# Altium schematic symbol library jlcpcb_2025_04_capacitors_extended_0402.schlib: 3594 symbols (part 15 of 20) (continued)
## GRM155R60J106ME11D (continued)

## GRM155R60J106ME15D
designator C?  Capacitance: 10uF  (hidden comment: *)
Capacitor, Ceramic (MLCC), 10uF, ±20%, 6.3V, X5R, ±20%, SMD 0402; Manufacturer: Murata Electronics; Manufacturer Part Number: GRM155R60J106ME15D; Package Size: 0402; JLCPCB Basic Part: No; JLCPCB Part Number: C412251; Supplier 1: LCSC; Category: Capacitors - MLCC; Supplier Part Number 1: C412251; Tolerance: ±20%; Voltage Rating: 6.3V; Temperature Coefficient: X5R; RoHS: Yes; ComponentLink1Description: Datasheet; ComponentLink1URL: https://wmsc.lcsc.com/wmsc/upload/file/pdf/v2/lcsc/2304140030_Murata-Electronics-GRM155R60J106ME15D_C412251.pdf; ComponentLink2Description: JLCPCB Part URL; ComponentLink2URL: https://jlcpcb.com/partdetail/C412251; ComponentLink3Description: LCSC Part URL; ComponentLink3URL: https://lcsc.com/product-detail/Multilayer-Ceramic-Capacitors-MLCC---SMD-SMT_Murata-Electronics-Murata-Electronics-GRM155R60J106ME15D_C412251.html
footprint CAP-0402 (0402 (1005M) Capacitor)
pins: 1, 2

## GRM155R60J106ME44D
designator C?  Capacitance: 10uF  (hidden comment: *)
Capacitor, Ceramic (MLCC), 10uF, ±20%, 6.3V, X5R, ±20%, SMD 0402; Manufacturer: Murata Electronics; Manufacturer Part Number: GRM155R60J106ME44D; Package Size: 0402; JLCPCB Basic Part: No; JLCPCB Part Number: C76991; Supplier 1: LCSC; Category: Capacitors - MLCC; Supplier Part Number 1: C76991; Tolerance: ±20%; Voltage Rating: 6.3V; Temperature Coefficient: X5R; RoHS: Yes; ComponentLink1Description: Datasheet; ComponentLink1URL: https://wmsc.lcsc.com/wmsc/upload/file/pdf/v2/lcsc/2304140030_Murata-Electronics-GRM155R60J106ME44D_C76991.pdf; ComponentLink2Description: JLCPCB Part URL; ComponentLink2URL: https://jlcpcb.com/partdetail/C76991; ComponentLink3Description: LCSC Part URL; ComponentLink3URL: https://lcsc.com/product-detail/Multilayer-Ceramic-Capacitors-MLCC---SMD-SMT_Murata-Electronics-Murata-Electronics-GRM155R60J106ME44D_C76991.html
footprint CAP-0402 (0402 (1005M) Capacitor)
pins: 1, 2

## GRM155R60J106ME47D
designator C?  Capacitance: 10uF  (hidden comment: *)
Capacitor, Ceramic (MLCC), 10uF, ±20%, 6.3V, X5R, ±20%, SMD 0402; Manufacturer: Murata Electronics; Manufacturer Part Number: GRM155R60J106ME47D; Package Size: 0402; JLCPCB Basic Part: No; JLCPCB Part Number: C668351; Supplier 1: LCSC; Category: Capacitors - MLCC; Supplier Part Number 1: C668351; Tolerance: ±20%; Voltage Rating: 6.3V; Temperature Coefficient: X5R; RoHS: Yes; ComponentLink1Description: Datasheet; ComponentLink1URL: https://wmsc.lcsc.com/wmsc/upload/file/pdf/v2/lcsc/2204211715_Murata-Electronics-GRM155R60J106ME47D_C668351.pdf; ComponentLink2Description: JLCPCB Part URL; ComponentLink2URL: https://jlcpcb.com/partdetail/C668351; ComponentLink3Description: LCSC Part URL; ComponentLink3URL: https://lcsc.com/product-detail/Multilayer-Ceramic-Capacitors-MLCC---SMD-SMT_Murata-Electronics-Murata-Electronics-GRM155R60J106ME47D_C668351.html
footprint CAP-0402 (0402 (1005M) Capacitor)
pins: 1, 2

## GRM155R60J156ME05D
designator C?  Capacitance: 15uF  (hidden comment: *)
Capacitor, Ceramic (MLCC), 15uF, ±20%, 6.3V, X5R, ±20%, SMD 0402; Manufacturer: Murata Electronics; Manufacturer Part Number: GRM155R60J156ME05D; Package Size: 0402; JLCPCB Basic Part: No; JLCPCB Part Number: C703069; Supplier 1: LCSC; Category: Capacitors - MLCC; Supplier Part Number 1: C703069; Tolerance: ±20%; Voltage Rating: 6.3V; Temperature Coefficient: X5R; RoHS: Yes; ComponentLink1Description: Datasheet; ComponentLink1URL: https://wmsc.lcsc.com/wmsc/upload/file/pdf/v2/lcsc/2304140030_Murata-Electronics-GRM155R60J156ME05D_C703069.pdf; ComponentLink2Description: JLCPCB Part URL; ComponentLink2URL: https://jlcpcb.com/partdetail/C703069; ComponentLink3Description: LCSC Part URL; ComponentLink3URL: https://lcsc.com/product-detail/Multilayer-Ceramic-Capacitors-MLCC---SMD-SMT_Murata-Electronics-Murata-Electronics-GRM155R60J156ME05D_C703069.html
footprint CAP-0402 (0402 (1005M) Capacitor)
pins: 1, 2

## GRM155R60J225KE01D
designator C?  Capacitance: 2.2uF  (hidden comment: *)
Capacitor, Ceramic (MLCC), 2.2uF, ±10%, 6.3V, X5R, ±10%, SMD 0402; Manufacturer: Murata Electronics; Manufacturer Part Number: GRM155R60J225KE01D; Package Size: 0402; JLCPCB Basic Part: No; JLCPCB Part Number: C319185; Supplier 1: LCSC; Category: Capacitors - MLCC; Supplier Part Number 1: C319185; Tolerance: ±10%; Voltage Rating: 6.3V; Temperature Coefficient: X5R; RoHS: Yes; ComponentLink1Description: Datasheet; ComponentLink1URL: https://wmsc.lcsc.com/wmsc/upload/file/pdf/v2/lcsc/1811081547_Murata-Electronics-GRM155R60J225KE01D_C319185.pdf; ComponentLink2Description: JLCPCB Part URL; ComponentLink2URL: https://jlcpcb.com/partdetail/C319185; ComponentLink3Description: LCSC Part URL; ComponentLink3URL: https://lcsc.com/product-detail/Multilayer-Ceramic-Capacitors-MLCC---SMD-SMT_Murata-Electronics-Murata-Electronics-GRM155R60J225KE01D_C319185.html
footprint CAP-0402 (0402 (1005M) Capacitor)
pins: 1, 2

## GRM155R60J225KE95D
designator C?  Capacitance: 2.2uF  (hidden comment: *)
Capacitor, Ceramic (MLCC), 2.2uF, ±10%, 6.3V, X5R, ±10%, SMD 0402; Manufacturer: Murata Electronics; Manufacturer Part Number: GRM155R60J225KE95D; Package Size: 0402; JLCPCB Basic Part: No; JLCPCB Part Number: C76992; Supplier 1: LCSC; Category: Capacitors - MLCC; Supplier Part Number 1: C76992; Tolerance: ±10%; Voltage Rating: 6.3V; Temperature Coefficient: X5R; RoHS: Yes; ComponentLink1Description: Datasheet; ComponentLink1URL: https://wmsc.lcsc.com/wmsc/upload/file/pdf/v2/lcsc/1811081615_Murata-Electronics-GRM155R60J225KE95D_C76992.pdf; ComponentLink2Description: JLCPCB Part URL; ComponentLink2URL: https://jlcpcb.com/partdetail/C76992; ComponentLink3Description: LCSC Part URL; ComponentLink3URL: https://lcsc.com/product-detail/Multilayer-Ceramic-Capacitors-MLCC---SMD-SMT_Murata-Electronics-Murata-Electronics-GRM155R60J225KE95D_C76992.html
footprint CAP-0402 (0402 (1005M) Capacitor)
pins: 1, 2

## GRM155R60J225ME15D
designator C?  Capacitance: 2.2uF  (hidden comment: *)
Capacitor, Ceramic (MLCC), 2.2uF, ±20%, 6.3V, X5R, ±20%, SMD 0402; Manufacturer: Murata Electronics; Manufacturer Part Number: GRM155R60J225ME15D; Package Size: 0402; JLCPCB Basic Part: No; JLCPCB Part Number: C76993; Supplier 1: LCSC; Category: Capacitors - MLCC; Supplier Part Number 1: C76993; Tolerance: ±20%; Voltage Rating: 6.3V; Temperature Coefficient: X5R; RoHS: Yes; ComponentLink1Description: Datasheet; ComponentLink1URL: https://wmsc.lcsc.com/wmsc/upload/file/pdf/v2/lcsc/1811081611_Murata-Electronics-GRM155R60J225ME15D_C76993.pdf; ComponentLink2Description: JLCPCB Part URL; ComponentLink2URL: https://jlcpcb.com/partdetail/C76993; ComponentLink3Description: LCSC Part URL; ComponentLink3URL: https://lcsc.com/product-detail/Multilayer-Ceramic-Capacitors-MLCC---SMD-SMT_Murata-Electronics-Murata-Electronics-GRM155R60J225ME15D_C76993.html
footprint CAP-0402 (0402 (1005M) Capacitor)
pins: 1, 2

## GRM155R60J225ME95D
designator C?  Capacitance: 2.2uF  (hidden comment: *)
Capacitor, Ceramic (MLCC), 2.2uF, ±20%, 6.3V, X5R, ±20%, SMD 0402; Manufacturer: Murata Electronics; Manufacturer Part Number: GRM155R60J225ME95D; Package Size: 0402; JLCPCB Basic Part: No; JLCPCB Part Number: C162169; Supplier 1: LCSC; Category: Capacitors - MLCC; Supplier Part Number 1: C162169; Tolerance: ±20%; Voltage Rating: 6.3V; Temperature Coefficient: X5R; RoHS: Yes; ComponentLink1Description: Datasheet; ComponentLink1URL: https://wmsc.lcsc.com/wmsc/upload/file/pdf/v2/lcsc/2304140030_Murata-Electronics-GRM155R60J225ME95D_C162169.pdf; ComponentLink2Description: JLCPCB Part URL; ComponentLink2URL: https://jlcpcb.com/partdetail/C162169; ComponentLink3Description: LCSC Part URL; ComponentLink3URL: https://lcsc.com/product-detail/Multilayer-Ceramic-Capacitors-MLCC---SMD-SMT_Murata-Electronics-Murata-Electronics-GRM155R60J225ME95D_C162169.html
footprint CAP-0402 (0402 (1005M) Capacitor)
pins: 1, 2

## GRM155R60J226ME11D
designator C?  Capacitance: 22uF  (hidden comment: *)
Capacitor, Ceramic (MLCC), 22uF, ±20%, 6.3V, X5R, ±20%, SMD 0402; Manufacturer: Murata Electronics; Manufacturer Part Number: GRM155R60J226ME11D; Package Size: 0402; JLCPCB Basic Part: No; JLCPCB Part Number: C415703; Supplier 1: LCSC; Category: Capacitors - MLCC; Supplier Part Number 1: C415703; Tolerance: ±20%; Voltage Rating: 6.3V; Temperature Coefficient: X5R; RoHS: Yes; ComponentLink1Description: Datasheet; ComponentLink1URL: https://wmsc.lcsc.com/wmsc/upload/file/pdf/v2/lcsc/2304140030_Murata-Electronics-GRM155R60J226ME11D_C415703.pdf; ComponentLink2Description: JLCPCB Part URL; ComponentLink2URL: https://jlcpcb.com/partdetail/C415703; ComponentLink3Description: LCSC Part URL; ComponentLink3URL: https://lcsc.com/product-detail/Multilayer-Ceramic-Capacitors-MLCC---SMD-SMT_Murata-Electronics-Murata-Electronics-GRM155R60J226ME11D_C415703.html
footprint CAP-0402 (0402 (1005M) Capacitor)
pins: 1, 2

## GRM155R60J334KE01D
designator C?  Capacitance: 330nF  (hidden comment: *)
Capacitor, Ceramic (MLCC), 330nF, ±10%, 6.3V, X5R, ±10%, SMD 0402; Manufacturer: Murata Electronics; Manufacturer Part Number: GRM155R60J334KE01D; Package Size: 0402; JLCPCB Basic Part: No; JLCPCB Part Number: C113046; Supplier 1: LCSC; Category: Capacitors - MLCC; Supplier Part Number 1: C113046; Tolerance: ±10%; Voltage Rating: 6.3V; Temperature Coefficient: X5R; RoHS: Yes; ComponentLink1Description: Datasheet; ComponentLink1URL: https://wmsc.lcsc.com/wmsc/upload/file/pdf/v2/lcsc/2304140030_Murata-Electronics-GRM155R60J334KE01D_C113046.pdf; ComponentLink2Description: JLCPCB Part URL; ComponentLink2URL: https://jlcpcb.com/partdetail/C113046; ComponentLink3Description: LCSC Part URL; ComponentLink3URL: https://lcsc.com/product-detail/Multilayer-Ceramic-Capacitors-MLCC---SMD-SMT_Murata-Electronics-Murata-Electronics-GRM155R60J334KE01D_C113046.html
footprint CAP-0402 (0402 (1005M) Capacitor)
pins: 1, 2

## GRM155R60J475KE96D
designator C?  Capacitance: 4.7uF  (hidden comment: *)
Capacitor, Ceramic (MLCC), 4.7uF, ±10%, 6.3V, X5R, ±10%, SMD 0402; Manufacturer: Murata Electronics; Manufacturer Part Number: GRM155R60J475KE96D; Package Size: 0402; JLCPCB Basic Part: No; JLCPCB Part Number: C76995; Supplier 1: LCSC; Category: Capacitors - MLCC; Supplier Part Number 1: C76995; Tolerance: ±10%; Voltage Rating: 6.3V; Temperature Coefficient: X5R; RoHS: Yes; ComponentLink1Description: Datasheet; ComponentLink1URL: https://wmsc.lcsc.com/wmsc/upload/file/pdf/v2/lcsc/2304140030_Murata-Electronics-GRM155R60J475KE96D_C76995.pdf; ComponentLink2Description: JLCPCB Part URL; ComponentLink2URL: https://jlcpcb.com/partdetail/C76995; ComponentLink3Description: LCSC Part URL; ComponentLink3URL: https://lcsc.com/product-detail/Multilayer-Ceramic-Capacitors-MLCC---SMD-SMT_Murata-Electronics-Murata-Electronics-GRM155R60J475KE96D_C76995.html
footprint CAP-0402 (0402 (1005M) Capacitor)
pins: 1, 2

## GRM155R60J475ME47D
designator C?  Capacitance: 4.7uF  (hidden comment: *)
Capacitor, Ceramic (MLCC), 4.7uF, ±20%, 6.3V, X5R, ±20%, SMD 0402; Manufacturer: Murata Electronics; Manufacturer Part Number: GRM155R60J475ME47D; Package Size: 0402; JLCPCB Basic Part: No; JLCPCB Part Number: C82453; Supplier 1: LCSC; Category: Capacitors - MLCC; Supplier Part Number 1: C82453; Tolerance: ±20%; Voltage Rating: 6.3V; Temperature Coefficient: X5R; RoHS: Yes; ComponentLink1Description: Datasheet; ComponentLink1URL: https://wmsc.lcsc.com/wmsc/upload/file/pdf/v2/lcsc/1811081616_Murata-Electronics-GRM155R60J475ME47D_C82453.pdf; ComponentLink2Description: JLCPCB Part URL; ComponentLink2URL: https://jlcpcb.com/partdetail/C82453; ComponentLink3Description: LCSC Part URL; ComponentLink3URL: https://lcsc.com/product-detail/Multilayer-Ceramic-Capacitors-MLCC---SMD-SMT_Murata-Electronics-Murata-Electronics-GRM155R60J475ME47D_C82453.html
footprint CAP-0402 (0402 (1005M) Capacitor)
pins: 1, 2

## GRM155R60J475ME87D
designator C?  Capacitance: 4.7uF  (hidden comment: *)
Capacitor, Ceramic (MLCC), 4.7uF, ±20%, 6.3V, X5R, ±20%, SMD 0402; Manufacturer: Murata Electronics; Manufacturer Part Number: GRM155R60J475ME87D; Package Size: 0402; JLCPCB Basic Part: No; JLCPCB Part Number: C76996; Supplier 1: LCSC; Category: Capacitors - MLCC; Supplier Part Number 1: C76996; Tolerance: ±20%; Voltage Rating: 6.3V; Temperature Coefficient: X5R; RoHS: Yes; ComponentLink1Description: Datasheet; ComponentLink1URL: https://wmsc.lcsc.com/wmsc/upload/file/pdf/v2/lcsc/1811081615_Murata-Electronics-GRM155R60J475ME87D_C76996.pdf; ComponentLink2Description: JLCPCB Part URL; ComponentLink2URL: https://jlcpcb.com/partdetail/C76996; ComponentLink3Description: LCSC Part URL; ComponentLink3URL: https://lcsc.com/product-detail/Multilayer-Ceramic-Capacitors-MLCC---SMD-SMT_Murata-Electronics-Murata-Electronics-GRM155R60J475ME87D_C76996.html
footprint CAP-0402 (0402 (1005M) Capacitor)
pins: 1, 2

## GRM155R60J475ME87J
designator C?  Capacitance: 4.7uF  (hidden comment: *)
Capacitor, Ceramic (MLCC), 4.7uF, ±20%, 6.3V, X5R, ±20%, SMD 0402; Manufacturer: Murata Electronics; Manufacturer Part Number: GRM155R60J475ME87J; Package Size: 0402; JLCPCB Basic Part: No; JLCPCB Part Number: C2176953; Supplier 1: LCSC; Category: Capacitors - MLCC; Supplier Part Number 1: C2176953; Tolerance: ±20%; Voltage Rating: 6.3V; Temperature Coefficient: X5R; RoHS: Yes; ComponentLink1Description: Datasheet; ComponentLink1URL: https://wmsc.lcsc.com/wmsc/upload/file/pdf/v2/lcsc/2202040900_Murata-Electronics-GRM155R60J475ME87J_C2176953.pdf; ComponentLink2Description: JLCPCB Part URL; ComponentLink2URL: https://jlcpcb.com/partdetail/C2176953; ComponentLink3Description: LCSC Part URL; ComponentLink3URL: https://lcsc.com/product-detail/Multilayer-Ceramic-Capacitors-MLCC---SMD-SMT_Murata-Electronics-Murata-Electronics-GRM155R60J475ME87J_C2176953.html
footprint CAP-0402 (0402 (1005M) Capacitor)
pins: 1, 2

## GRM155R61A105KE01D
designator C?  Capacitance: 1uF  (hidden comment: *)
Capacitor, Ceramic (MLCC), 1uF, ±10%, 10V, X5R, ±10%, SMD 0402; Manufacturer: Murata Electronics; Manufacturer Part Number: GRM155R61A105KE01D; Package Size: 0402; JLCPCB Basic Part: No; JLCPCB Part Number: C389008; Supplier 1: LCSC; Category: Capacitors - MLCC; Supplier Part Number 1: C389008; Tolerance: ±10%; Voltage Rating: 10V; Temperature Coefficient: X5R; RoHS: Yes; ComponentLink1Description: Datasheet; ComponentLink1URL: https://wmsc.lcsc.com/wmsc/upload/file/pdf/v2/lcsc/1912111437_Murata-Electronics-GRM155R61A105KE01D_C389008.pdf; ComponentLink2Description: JLCPCB Part URL; ComponentLink2URL: https://jlcpcb.com/partdetail/C389008; ComponentLink3Description: LCSC Part URL; ComponentLink3URL: https://lcsc.com/product-detail/Multilayer-Ceramic-Capacitors-MLCC---SMD-SMT_Murata-Electronics-Murata-Electronics-GRM155R61A105KE01D_C389008.html
footprint CAP-0402 (0402 (1005M) Capacitor)
pins: 1, 2

## GRM155R61A105KE15D
designator C?  Capacitance: 1uF  (hidden comment: *)
Capacitor, Ceramic (MLCC), 1uF, ±10%, 10V, X5R, ±10%, SMD 0402; Manufacturer: Murata Electronics; Manufacturer Part Number: GRM155R61A105KE15D; Package Size: 0402; JLCPCB Basic Part: No; JLCPCB Part Number: C76999; Supplier 1: LCSC; Category: Capacitors - MLCC; Supplier Part Number 1: C76999; Tolerance: ±10%; Voltage Rating: 10V; Temperature Coefficient: X5R; RoHS: Yes; ComponentLink1Description: Datasheet; ComponentLink1URL: https://wmsc.lcsc.com/wmsc/upload/file/pdf/v2/lcsc/1810201320_Murata-Electronics-GRM155R61A105KE15D_C76999.pdf; ComponentLink2Description: JLCPCB Part URL; ComponentLink2URL: https://jlcpcb.com/partdetail/C76999; ComponentLink3Description: LCSC Part URL; ComponentLink3URL: https://lcsc.com/product-detail/Multilayer-Ceramic-Capacitors-MLCC---SMD-SMT_Murata-Electronics-Murata-Electronics-GRM155R61A105KE15D_C76999.html
footprint CAP-0402 (0402 (1005M) Capacitor)
pins: 1, 2

## GRM155R61A106ME11D
designator C?  Capacitance: 10uF  (hidden comment: *)
Capacitor, Ceramic (MLCC), 10uF, ±20%, 10V, X5R, ±20%, SMD 0402; Manufacturer: Murata Electronics; Manufacturer Part Number: GRM155R61A106ME11D; Package Size: 0402; JLCPCB Basic Part: No; JLCPCB Part Number: C408132; Supplier 1: LCSC; Category: Capacitors - MLCC; Supplier Part Number 1: C408132; Tolerance: ±20%; Voltage Rating: 10V; Temperature Coefficient: X5R; RoHS: Yes; ComponentLink1Description: Datasheet; ComponentLink1URL: https://wmsc.lcsc.com/wmsc/upload/file/pdf/v2/lcsc/2304140030_Murata-Electronics-GRM155R61A106ME11D_C408132.pdf; ComponentLink2Description: JLCPCB Part URL; ComponentLink2URL: https://jlcpcb.com/partdetail/C408132; ComponentLink3Description: LCSC Part URL; ComponentLink3URL: https://lcsc.com/product-detail/Multilayer-Ceramic-Capacitors-MLCC---SMD-SMT_Murata-Electronics-Murata-Electronics-GRM155R61A106ME11D_C408132.html
footprint CAP-0402 (0402 (1005M) Capacitor)
pins: 1, 2

## GRM155R61A106ME21D
designator C?  Capacitance: 10uF  (hidden comment: *)
Capacitor, Ceramic (MLCC), 10uF, ±20%, 10V, X5R, ±20%, SMD 0402; Manufacturer: Murata Electronics; Manufacturer Part Number: GRM155R61A106ME21D; Package Size: 0402; JLCPCB Basic Part: No; JLCPCB Part Number: C324476; Supplier 1: LCSC; Category: Capacitors - MLCC; Supplier Part Number 1: C324476; Tolerance: ±20%; Voltage Rating: 10V; Temperature Coefficient: X5R; RoHS: Yes; ComponentLink1Description: Datasheet; ComponentLink1URL: https://wmsc.lcsc.com/wmsc/upload/file/pdf/v2/lcsc/1811071230_Murata-Electronics-GRM155R61A106ME21D_C324476.pdf; ComponentLink2Description: JLCPCB Part URL; ComponentLink2URL: https://jlcpcb.com/partdetail/C324476; ComponentLink3Description: LCSC Part URL; ComponentLink3URL: https://lcsc.com/product-detail/Multilayer-Ceramic-Capacitors-MLCC---SMD-SMT_Murata-Electronics-Murata-Electronics-GRM155R61A106ME21D_C324476.html
footprint CAP-0402 (0402 (1005M) Capacitor)
pins: 1, 2

## GRM155R61A106ME44D
designator C?  Capacitance: 10uF  (hidden comment: *)
Capacitor, Ceramic (MLCC), 10uF, ±20%, 10V, X5R, ±20%, SMD 0402; Manufacturer: Murata Electronics; Manufacturer Part Number: GRM155R61A106ME44D; Package Size: 0402; JLCPCB Basic Part: No; JLCPCB Part Number: C77000; Supplier 1: LCSC; Category: Capacitors - MLCC; Supplier Part Number 1: C77000; Tolerance: ±20%; Voltage Rating: 10V; Temperature Coefficient: X5R; RoHS: Yes; ComponentLink1Description: Datasheet; ComponentLink1URL: https://wmsc.lcsc.com/wmsc/upload/file/pdf/v2/lcsc/1811141510_Murata-Electronics-GRM155R61A106ME44D_C77000.pdf; ComponentLink2Description: JLCPCB Part URL; ComponentLink2URL: https://jlcpcb.com/partdetail/C77000; ComponentLink3Description: LCSC Part URL; ComponentLink3URL: https://lcsc.com/product-detail/Multilayer-Ceramic-Capacitors-MLCC---SMD-SMT_Murata-Electronics-Murata-Electronics-GRM155R61A106ME44D_C77000.html
footprint CAP-0402 (0402 (1005M) Capacitor)
pins: 1, 2

## GRM155R61A124KE19D
designator C?  Capacitance: 120nF  (hidden comment: *)
Capacitor, Ceramic (MLCC), 120nF, ±10%, 10V, X5R, ±10%, SMD 0402; Manufacturer: Murata Electronics; Manufacturer Part Number: GRM155R61A124KE19D; Package Size: 0402; JLCPCB Basic Part: No; JLCPCB Part Number: C426033; Supplier 1: LCSC; Category: Capacitors - MLCC; Supplier Part Number 1: C426033; Tolerance: ±10%; Voltage Rating: 10V; Temperature Coefficient: X5R; RoHS: Yes; ComponentLink1Description: Datasheet; ComponentLink1URL: https://wmsc.lcsc.com/wmsc/upload/file/pdf/v2/lcsc/2304140030_Murata-Electronics-GRM155R61A124KE19D_C426033.pdf; ComponentLink2Description: JLCPCB Part URL; ComponentLink2URL: https://jlcpcb.com/partdetail/C426033; ComponentLink3Description: LCSC Part URL; ComponentLink3URL: https://lcsc.com/product-detail/Multilayer-Ceramic-Capacitors-MLCC---SMD-SMT_Murata-Electronics-Murata-Electronics-GRM155R61A124KE19D_C426033.html
footprint CAP-0402 (0402 (1005M) Capacitor)
pins: 1, 2

## GRM155R61A224JE19D
designator C?  Capacitance: 220nF  (hidden comment: *)
Capacitor, Ceramic (MLCC), 220nF, ±5%, 10V, X5R, ±5%, SMD 0402; Manufacturer: Murata Electronics; Manufacturer Part Number: GRM155R61A224JE19D; Package Size: 0402; JLCPCB Basic Part: No; JLCPCB Part Number: C882536; Supplier 1: LCSC; Category: Capacitors - MLCC; Supplier Part Number 1: C882536; Tolerance: ±5%; Voltage Rating: 10V; Temperature Coefficient: X5R; RoHS: Yes; ComponentLink1Description: Datasheet; ComponentLink1URL: https://wmsc.lcsc.com/wmsc/upload/file/pdf/v2/lcsc/2201242130_Murata-Electronics-GRM155R61A224JE19D_C882536.pdf; ComponentLink2Description: JLCPCB Part URL; ComponentLink2URL: https://jlcpcb.com/partdetail/C882536; ComponentLink3Description: LCSC Part URL; ComponentLink3URL: https://lcsc.com/product-detail/Multilayer-Ceramic-Capacitors-MLCC---SMD-SMT_Murata-Electronics-Murata-Electronics-GRM155R61A224JE19D_C882536.html
footprint CAP-0402 (0402 (1005M) Capacitor)
pins: 1, 2

## GRM155R61A224KE19D
designator C?  Capacitance: 220nF  (hidden comment: *)
Capacitor, Ceramic (MLCC), 220nF, ±10%, 10V, X5R, ±10%, SMD 0402; Manufacturer: Murata Electronics; Manufacturer Part Number: GRM155R61A224KE19D; Package Size: 0402; JLCPCB Basic Part: No; JLCPCB Part Number: C77001; Supplier 1: LCSC; Category: Capacitors - MLCC; Supplier Part Number 1: C77001; Tolerance: ±10%; Voltage Rating: 10V; Temperature Coefficient: X5R; RoHS: Yes; ComponentLink1Description: Datasheet; ComponentLink1URL: https://wmsc.lcsc.com/wmsc/upload/file/pdf/v2/lcsc/1810201311_Murata-Electronics-GRM155R61A224KE19D_C77001.pdf; ComponentLink2Description: JLCPCB Part URL; ComponentLink2URL: https://jlcpcb.com/partdetail/C77001; ComponentLink3Description: LCSC Part URL; ComponentLink3URL: https://lcsc.com/product-detail/Multilayer-Ceramic-Capacitors-MLCC---SMD-SMT_Murata-Electronics-Murata-Electronics-GRM155R61A224KE19D_C77001.html
footprint CAP-0402 (0402 (1005M) Capacitor)
pins: 1, 2

## GRM155R61A225KE01D
designator C?  Capacitance: 2.2uF  (hidden comment: *)
Capacitor, Ceramic (MLCC), 2.2uF, ±10%, 10V, X5R, ±10%, SMD 0402; Manufacturer: Murata Electronics; Manufacturer Part Number: GRM155R61A225KE01D; Package Size: 0402; JLCPCB Basic Part: No; JLCPCB Part Number: C907966; Supplier 1: LCSC; Category: Capacitors - MLCC; Supplier Part Number 1: C907966; Tolerance: ±10%; Voltage Rating: 10V; Temperature Coefficient: X5R; RoHS: Yes; ComponentLink1Description: Datasheet; ComponentLink1URL: https://wmsc.lcsc.com/wmsc/upload/file/pdf/v2/lcsc/2201242100_Murata-Electronics-GRM155R61A225KE01D_C907966.pdf; ComponentLink2Description: JLCPCB Part URL; ComponentLink2URL: https://jlcpcb.com/partdetail/C907966; ComponentLink3Description: LCSC Part URL; ComponentLink3URL: https://lcsc.com/product-detail/Multilayer-Ceramic-Capacitors-MLCC---SMD-SMT_Murata-Electronics-Murata-Electronics-GRM155R61A225KE01D_C907966.html
footprint CAP-0402 (0402 (1005M) Capacitor)
pins: 1, 2

## GRM155R61A225KE95D
designator C?  Capacitance: 2.2uF  (hidden comment: *)
Capacitor, Ceramic (MLCC), 2.2uF, ±10%, 10V, X5R, ±10%, SMD 0402; Manufacturer: Murata Electronics; Manufacturer Part Number: GRM155R61A225KE95D; Package Size: 0402; JLCPCB Basic Part: No; JLCPCB Part Number: C77002; Supplier 1: LCSC; Category: Capacitors - MLCC; Supplier Part Number 1: C77002; Tolerance: ±10%; Voltage Rating: 10V; Temperature Coefficient: X5R; RoHS: Yes; ComponentLink1Description: Datasheet; ComponentLink1URL: https://wmsc.lcsc.com/wmsc/upload/file/pdf/v2/lcsc/1811081616_Murata-Electronics-GRM155R61A225KE95D_C77002.pdf; ComponentLink2Description: JLCPCB Part URL; ComponentLink2URL: https://jlcpcb.com/partdetail/C77002; ComponentLink3Description: LCSC Part URL; ComponentLink3URL: https://lcsc.com/product-detail/Multilayer-Ceramic-Capacitors-MLCC---SMD-SMT_Murata-Electronics-Murata-Electronics-GRM155R61A225KE95D_C77002.html
footprint CAP-0402 (0402 (1005M) Capacitor)
pins: 1, 2

## GRM155R61A225ME01D
designator C?  Capacitance: 2.2uF  (hidden comment: *)
Capacitor, Ceramic (MLCC), 2.2uF, ±20%, 10V, X5R, ±20%, SMD 0402; Manufacturer: Murata Electronics; Manufacturer Part Number: GRM155R61A225ME01D; Package Size: 0402; JLCPCB Basic Part: No; JLCPCB Part Number: C385031; Supplier 1: LCSC; Category: Capacitors - MLCC; Supplier Part Number 1: C385031; Tolerance: ±20%; Voltage Rating: 10V; Temperature Coefficient: X5R; RoHS: Yes; ComponentLink1Description: Datasheet; ComponentLink1URL: https://wmsc.lcsc.com/wmsc/upload/file/pdf/v2/lcsc/1912111437_Murata-Electronics-GRM155R61A225ME01D_C385031.pdf; ComponentLink2Description: JLCPCB Part URL; ComponentLink2URL: https://jlcpcb.com/partdetail/C385031; ComponentLink3Description: LCSC Part URL; ComponentLink3URL: https://lcsc.com/product-detail/Multilayer-Ceramic-Capacitors-MLCC---SMD-SMT_Murata-Electronics-Murata-Electronics-GRM155R61A225ME01D_C385031.html
footprint CAP-0402 (0402 (1005M) Capacitor)
pins: 1, 2

## GRM155R61A274KE15D
designator C?  Capacitance: 270nF  (hidden comment: *)
Capacitor, Ceramic (MLCC), 270nF, ±10%, 10V, X5R, ±10%, SMD 0402; Manufacturer: Murata Electronics; Manufacturer Part Number: GRM155R61A274KE15D; Package Size: 0402; JLCPCB Basic Part: No; JLCPCB Part Number: C701264; Supplier 1: LCSC; Category: Capacitors - MLCC; Supplier Part Number 1: C701264; Tolerance: ±10%; Voltage Rating: 10V; Temperature Coefficient: X5R; RoHS: Yes; ComponentLink1Description: Datasheet; ComponentLink1URL: https://wmsc.lcsc.com/wmsc/upload/file/pdf/v2/lcsc/2304140030_Murata-Electronics-GRM155R61A274KE15D_C701264.pdf; ComponentLink2Description: JLCPCB Part URL; ComponentLink2URL: https://jlcpcb.com/partdetail/C701264; ComponentLink3Description: LCSC Part URL; ComponentLink3URL: https://lcsc.com/product-detail/Multilayer-Ceramic-Capacitors-MLCC---SMD-SMT_Murata-Electronics-Murata-Electronics-GRM155R61A274KE15D_C701264.html
footprint CAP-0402 (0402 (1005M) Capacitor)
pins: 1, 2

## GRM155R61A333KA01D
designator C?  Capacitance: 33nF  (hidden comment: *)
Capacitor, Ceramic (MLCC), 33nF, ±10%, 10V, X5R, ±10%, SMD 0402; Manufacturer: Murata Electronics; Manufacturer Part Number: GRM155R61A333KA01D; Package Size: 0402; JLCPCB Basic Part: No; JLCPCB Part Number: C162172; Supplier 1: LCSC; Category: Capacitors - MLCC; Supplier Part Number 1: C162172; Tolerance: ±10%; Voltage Rating: 10V; Temperature Coefficient: X5R; RoHS: Yes; ComponentLink1Description: Datasheet; ComponentLink1URL: https://wmsc.lcsc.com/wmsc/upload/file/pdf/v2/lcsc/2304140030_Murata-Electronics-GRM155R61A333KA01D_C162172.pdf; ComponentLink2Description: JLCPCB Part URL; ComponentLink2URL: https://jlcpcb.com/partdetail/C162172; ComponentLink3Description: LCSC Part URL; ComponentLink3URL: https://lcsc.com/product-detail/Multilayer-Ceramic-Capacitors-MLCC---SMD-SMT_Murata-Electronics-Murata-Electronics-GRM155R61A333KA01D_C162172.html
footprint CAP-0402 (0402 (1005M) Capacitor)
pins: 1, 2

## GRM155R61A393KA01D
designator C?  Capacitance: 39nF  (hidden comment: *)
Capacitor, Ceramic (MLCC), 39nF, ±10%, 10V, X5R, ±10%, SMD 0402; Manufacturer: Murata Electronics; Manufacturer Part Number: GRM155R61A393KA01D; Package Size: 0402; JLCPCB Basic Part: No; JLCPCB Part Number: C470849; Supplier 1: LCSC; Category: Capacitors - MLCC; Supplier Part Number 1: C470849; Tolerance: ±10%; Voltage Rating: 10V; Temperature Coefficient: X5R; RoHS: Yes; ComponentLink1Description: Datasheet; ComponentLink1URL: https://wmsc.lcsc.com/wmsc/upload/file/pdf/v2/lcsc/1912181209_Murata-Electronics-GRM155R61A393KA01D_C470849.pdf; ComponentLink2Description: JLCPCB Part URL; ComponentLink2URL: https://jlcpcb.com/partdetail/C470849; ComponentLink3Description: LCSC Part URL; ComponentLink3URL: https://lcsc.com/product-detail/Multilayer-Ceramic-Capacitors-MLCC---SMD-SMT_Murata-Electronics-Murata-Electronics-GRM155R61A393KA01D_C470849.html
footprint CAP-0402 (0402 (1005M) Capacitor)
pins: 1, 2

## GRM155R61A394KE15D
designator C?  Capacitance: 390nF  (hidden comment: *)
Capacitor, Ceramic (MLCC), 390nF, ±10%, 10V, X5R, ±10%, SMD 0402; Manufacturer: Murata Electronics; Manufacturer Part Number: GRM155R61A394KE15D; Package Size: 0402; JLCPCB Basic Part: No; JLCPCB Part Number: C350937; Supplier 1: LCSC; Category: Capacitors - MLCC; Supplier Part Number 1: C350937; Tolerance: ±10%; Voltage Rating: 10V; Temperature Coefficient: X5R; RoHS: Yes; ComponentLink1Description: Datasheet; ComponentLink1URL: https://wmsc.lcsc.com/wmsc/upload/file/pdf/v2/lcsc/1912111437_Murata-Electronics-GRM155R61A394KE15D_C350937.pdf; ComponentLink2Description: JLCPCB Part URL; ComponentLink2URL: https://jlcpcb.com/partdetail/C350937; ComponentLink3Description: LCSC Part URL; ComponentLink3URL: https://lcsc.com/product-detail/Multilayer-Ceramic-Capacitors-MLCC---SMD-SMT_Murata-Electronics-Murata-Electronics-GRM155R61A394KE15D_C350937.html
footprint CAP-0402 (0402 (1005M) Capacitor)
pins: 1, 2

## GRM155R61A474KE15D
designator C?  Capacitance: 470nF  (hidden comment: *)
Capacitor, Ceramic (MLCC), 470nF, ±10%, 10V, X5R, ±10%, SMD 0402; Manufacturer: Murata Electronics; Manufacturer Part Number: GRM155R61A474KE15D; Package Size: 0402; JLCPCB Basic Part: No; JLCPCB Part Number: C77003; Supplier 1: LCSC; Category: Capacitors - MLCC; Supplier Part Number 1: C77003; Tolerance: ±10%; Voltage Rating: 10V; Temperature Coefficient: X5R; RoHS: Yes; ComponentLink1Description: Datasheet; ComponentLink1URL: https://wmsc.lcsc.com/wmsc/upload/file/pdf/v2/lcsc/1811081612_Murata-Electronics-GRM155R61A474KE15D_C77003.pdf; ComponentLink2Description: JLCPCB Part URL; ComponentLink2URL: https://jlcpcb.com/partdetail/C77003; ComponentLink3Description: LCSC Part URL; ComponentLink3URL: https://lcsc.com/product-detail/Multilayer-Ceramic-Capacitors-MLCC---SMD-SMT_Murata-Electronics-Murata-Electronics-GRM155R61A474KE15D_C77003.html
footprint CAP-0402 (0402 (1005M) Capacitor)
pins: 1, 2

## GRM155R61A474ME15D
designator C?  Capacitance: 470nF  (hidden comment: *)
Capacitor, Ceramic (MLCC), 470nF, ±20%, 10V, X5R, ±20%, SMD 0402; Manufacturer: Murata Electronics; Manufacturer Part Number: GRM155R61A474ME15D; Package Size: 0402; JLCPCB Basic Part: No; JLCPCB Part Number: C692638; Supplier 1: LCSC; Category: Capacitors - MLCC; Supplier Part Number 1: C692638; Tolerance: ±20%; Voltage Rating: 10V; Temperature Coefficient: X5R; RoHS: Yes; ComponentLink1Description: Datasheet; ComponentLink1URL: https://wmsc.lcsc.com/wmsc/upload/file/pdf/v2/lcsc/2401241420_Murata-Electronics-GRM155R61A474ME15D_C692638.pdf; ComponentLink2Description: JLCPCB Part URL; ComponentLink2URL: https://jlcpcb.com/partdetail/C692638; ComponentLink3Description: LCSC Part URL; ComponentLink3URL: https://lcsc.com/product-detail/Multilayer-Ceramic-Capacitors-MLCC---SMD-SMT_Murata-Electronics-Murata-Electronics-GRM155R61A474ME15D_C692638.html
footprint CAP-0402 (0402 (1005M) Capacitor)
pins: 1, 2

## GRM155R61A475KEAAD
designator C?  Capacitance: 4.7uF  (hidden comment: *)
Capacitor, Ceramic (MLCC), 4.7uF, ±10%, 10V, X5R, ±10%, SMD 0402; Manufacturer: Murata Electronics; Manufacturer Part Number: GRM155R61A475KEAAD; Package Size: 0402; JLCPCB Basic Part: No; JLCPCB Part Number: C77004; Supplier 1: LCSC; Category: Capacitors - MLCC; Supplier Part Number 1: C77004; Tolerance: ±10%; Voltage Rating: 10V; Temperature Coefficient: X5R; RoHS: Yes; ComponentLink1Description: Datasheet; ComponentLink1URL: https://wmsc.lcsc.com/wmsc/upload/file/pdf/v2/lcsc/1811081617_Murata-Electronics-GRM155R61A475KEAAD_C77004.pdf; ComponentLink2Description: JLCPCB Part URL; ComponentLink2URL: https://jlcpcb.com/partdetail/C77004; ComponentLink3Description: LCSC Part URL; ComponentLink3URL: https://lcsc.com/product-detail/Multilayer-Ceramic-Capacitors-MLCC---SMD-SMT_Murata-Electronics-Murata-Electronics-GRM155R61A475KEAAD_C77004.html
footprint CAP-0402 (0402 (1005M) Capacitor)
pins: 1, 2

## GRM155R61A475ME02D
designator C?  Capacitance: 4.7uF  (hidden comment: *)
Capacitor, Ceramic (MLCC), 4.7uF, ±20%, 10V, X5R, ±20%, SMD 0402; Manufacturer: Murata Electronics; Manufacturer Part Number: GRM155R61A475ME02D; Package Size: 0402; JLCPCB Basic Part: No; JLCPCB Part Number: C669501; Supplier 1: LCSC; Category: Capacitors - MLCC; Supplier Part Number 1: C669501; Tolerance: ±20%; Voltage Rating: 10V; Temperature Coefficient: X5R; RoHS: Yes; ComponentLink1Description: Datasheet; ComponentLink1URL: https://wmsc.lcsc.com/wmsc/upload/file/pdf/v2/lcsc/2007221808_Murata-Electronics-GRM155R61A475ME02D_C669501.pdf; ComponentLink2Description: JLCPCB Part URL; ComponentLink2URL: https://jlcpcb.com/partdetail/C669501; ComponentLink3Description: LCSC Part URL; ComponentLink3URL: https://lcsc.com/product-detail/Multilayer-Ceramic-Capacitors-MLCC---SMD-SMT_Murata-Electronics-Murata-Electronics-GRM155R61A475ME02D_C669501.html
footprint CAP-0402 (0402 (1005M) Capacitor)
pins: 1, 2

## GRM155R61A475MEAAD
designator C?  Capacitance: 4.7uF  (hidden comment: *)
Capacitor, Ceramic (MLCC), 4.7uF, ±20%, 10V, X5R, ±20%, SMD 0402; Manufacturer: Murata Electronics; Manufacturer Part Number: GRM155R61A475MEAAD; Package Size: 0402; JLCPCB Basic Part: No; JLCPCB Part Number: C335105; Supplier 1: LCSC; Category: Capacitors - MLCC; Supplier Part Number 1: C335105; Tolerance: ±20%; Voltage Rating: 10V; Temperature Coefficient: X5R; RoHS: Yes; ComponentLink1Description: Datasheet; ComponentLink1URL: https://wmsc.lcsc.com/wmsc/upload/file/pdf/v2/lcsc/2304140030_Murata-Electronics-GRM155R61A475MEAAD_C335105.pdf; ComponentLink2Description: JLCPCB Part URL; ComponentLink2URL: https://jlcpcb.com/partdetail/C335105; ComponentLink3Description: LCSC Part URL; ComponentLink3URL: https://lcsc.com/product-detail/Multilayer-Ceramic-Capacitors-MLCC---SMD-SMT_Murata-Electronics-Murata-Electronics-GRM155R61A475MEAAD_C335105.html
footprint CAP-0402 (0402 (1005M) Capacitor)
pins: 1, 2

## GRM155R61A564KE15D
designator C?  Capacitance: 560nF  (hidden comment: *)
Capacitor, Ceramic (MLCC), 560nF, ±10%, 10V, X5R, ±10%, SMD 0402; Manufacturer: Murata Electronics; Manufacturer Part Number: GRM155R61A564KE15D; Package Size: 0402; JLCPCB Basic Part: No; JLCPCB Part Number: C162174; Supplier 1: LCSC; Category: Capacitors - MLCC; Supplier Part Number 1: C162174; Tolerance: ±10%; Voltage Rating: 10V; Temperature Coefficient: X5R; RoHS: Yes; ComponentLink1Description: Datasheet; ComponentLink1URL: https://wmsc.lcsc.com/wmsc/upload/file/pdf/v2/lcsc/2304140030_Murata-Electronics-GRM155R61A564KE15D_C162174.pdf; ComponentLink2Description: JLCPCB Part URL; ComponentLink2URL: https://jlcpcb.com/partdetail/C162174; ComponentLink3Description: LCSC Part URL; ComponentLink3URL: https://lcsc.com/product-detail/Multilayer-Ceramic-Capacitors-MLCC---SMD-SMT_Murata-Electronics-Murata-Electronics-GRM155R61A564KE15D_C162174.html
footprint CAP-0402 (0402 (1005M) Capacitor)
pins: 1, 2

## GRM155R61A684KE15D
designator C?  Capacitance: 680nF  (hidden comment: *)
Capacitor, Ceramic (MLCC), 680nF, ±10%, 10V, X5R, ±10%, SMD 0402; Manufacturer: Murata Electronics; Manufacturer Part Number: GRM155R61A684KE15D; Package Size: 0402; JLCPCB Basic Part: No; JLCPCB Part Number: C97866; Supplier 1: LCSC; Category: Capacitors - MLCC; Supplier Part Number 1: C97866; Tolerance: ±10%; Voltage Rating: 10V; Temperature Coefficient: X5R; RoHS: Yes; ComponentLink1Description: Datasheet; ComponentLink1URL: https://wmsc.lcsc.com/wmsc/upload/file/pdf/v2/lcsc/1811081531_Murata-Electronics-GRM155R61A684KE15D_C97866.pdf; ComponentLink2Description: JLCPCB Part URL; ComponentLink2URL: https://jlcpcb.com/partdetail/C97866; ComponentLink3Description: LCSC Part URL; ComponentLink3URL: https://lcsc.com/product-detail/Multilayer-Ceramic-Capacitors-MLCC---SMD-SMT_Murata-Electronics-Murata-Electronics-GRM155R61A684KE15D_C97866.html
footprint CAP-0402 (0402 (1005M) Capacitor)
pins: 1, 2

## GRM155R61C102KA01D
designator C?  Capacitance: 1nF  (hidden comment: *)
Capacitor, Ceramic (MLCC), 1nF, ±10%, 16V, X5R, ±10%, SMD 0402; Manufacturer: Murata Electronics; Manufacturer Part Number: GRM155R61C102KA01D; Package Size: 0402; JLCPCB Basic Part: No; JLCPCB Part Number: C437524; Supplier 1: LCSC; Category: Capacitors - MLCC; Supplier Part Number 1: C437524; Tolerance: ±10%; Voltage Rating: 16V; Temperature Coefficient: X5R; RoHS: Yes; ComponentLink1Description: Datasheet; ComponentLink1URL: https://wmsc.lcsc.com/wmsc/upload/file/pdf/v2/lcsc/2304140030_Murata-Electronics-GRM155R61C102KA01D_C437524.pdf; ComponentLink2Description: JLCPCB Part URL; ComponentLink2URL: https://jlcpcb.com/partdetail/C437524; ComponentLink3Description: LCSC Part URL; ComponentLink3URL: https://lcsc.com/product-detail/Multilayer-Ceramic-Capacitors-MLCC---SMD-SMT_Murata-Electronics-Murata-Electronics-GRM155R61C102KA01D_C437524.html
footprint CAP-0402 (0402 (1005M) Capacitor)
pins: 1, 2

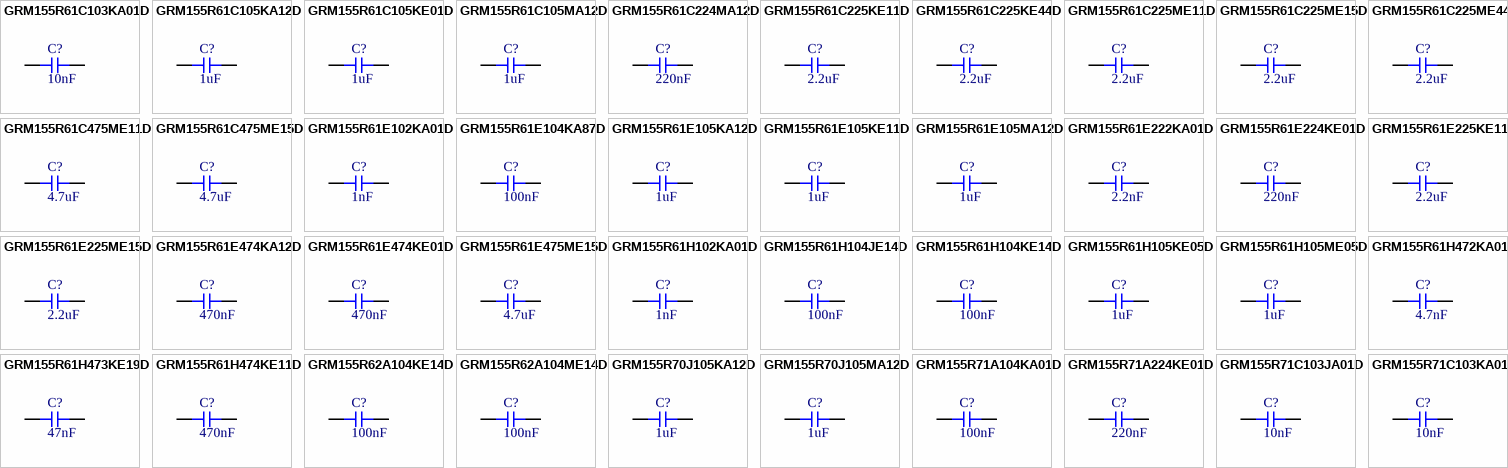
[diagram p68: symbols GRM155R61C103KA01D to GRM155R71C103KA01D]

## GRM155R61C103KA01D
designator C?  Capacitance: 10nF  (hidden comment: *)
Capacitor, Ceramic (MLCC), 10nF, ±10%, 16V, X5R, ±10%, SMD 0402; Manufacturer: Murata Electronics; Manufacturer Part Number: GRM155R61C103KA01D; Package Size: 0402; JLCPCB Basic Part: No; JLCPCB Part Number: C437525; Supplier 1: LCSC; Category: Capacitors - MLCC; Supplier Part Number 1: C437525; Tolerance: ±10%; Voltage Rating: 16V; Temperature Coefficient: X5R; RoHS: Yes; ComponentLink1Description: Datasheet; ComponentLink1URL: https://wmsc.lcsc.com/wmsc/upload/file/pdf/v2/lcsc/2304140030_Murata-Electronics-GRM155R61C103KA01D_C437525.pdf; ComponentLink2Description: JLCPCB Part URL; ComponentLink2URL: https://jlcpcb.com/partdetail/C437525; ComponentLink3Description: LCSC Part URL; ComponentLink3URL: https://lcsc.com/product-detail/Multilayer-Ceramic-Capacitors-MLCC---SMD-SMT_Murata-Electronics-Murata-Electronics-GRM155R61C103KA01D_C437525.html
footprint CAP-0402 (0402 (1005M) Capacitor)
pins: 1, 2

## GRM155R61C105KA12D
designator C?  Capacitance: 1uF  (hidden comment: *)
Capacitor, Ceramic (MLCC), 1uF, ±10%, 16V, X5R, ±10%, SMD 0402; Manufacturer: Murata Electronics; Manufacturer Part Number: GRM155R61C105KA12D; Package Size: 0402; JLCPCB Basic Part: No; JLCPCB Part Number: C77006; Supplier 1: LCSC; Category: Capacitors - MLCC; Supplier Part Number 1: C77006; Tolerance: ±10%; Voltage Rating: 16V; Temperature Coefficient: X5R; RoHS: Yes; ComponentLink1Description: Datasheet; ComponentLink1URL: https://wmsc.lcsc.com/wmsc/upload/file/pdf/v2/lcsc/1811151411_Murata-Electronics-GRM155R61C105KA12D_C77006.pdf; ComponentLink2Description: JLCPCB Part URL; ComponentLink2URL: https://jlcpcb.com/partdetail/C77006; ComponentLink3Description: LCSC Part URL; ComponentLink3URL: https://lcsc.com/product-detail/Multilayer-Ceramic-Capacitors-MLCC---SMD-SMT_Murata-Electronics-Murata-Electronics-GRM155R61C105KA12D_C77006.html
footprint CAP-0402 (0402 (1005M) Capacitor)
pins: 1, 2

## GRM155R61C105KE01D
designator C?  Capacitance: 1uF  (hidden comment: *)
Capacitor, Ceramic (MLCC), 1uF, ±10%, 16V, X5R, ±10%, SMD 0402; Manufacturer: Murata Electronics; Manufacturer Part Number: GRM155R61C105KE01D; Package Size: 0402; JLCPCB Basic Part: No; JLCPCB Part Number: C77007; Supplier 1: LCSC; Category: Capacitors - MLCC; Supplier Part Number 1: C77007; Tolerance: ±10%; Voltage Rating: 16V; Temperature Coefficient: X5R; RoHS: Yes; ComponentLink1Description: Datasheet; ComponentLink1URL: https://wmsc.lcsc.com/wmsc/upload/file/pdf/v2/lcsc/1811081724_Murata-Electronics-GRM155R61C105KE01D_C77007.pdf; ComponentLink2Description: JLCPCB Part URL; ComponentLink2URL: https://jlcpcb.com/partdetail/C77007; ComponentLink3Description: LCSC Part URL; ComponentLink3URL: https://lcsc.com/product-detail/Multilayer-Ceramic-Capacitors-MLCC---SMD-SMT_Murata-Electronics-Murata-Electronics-GRM155R61C105KE01D_C77007.html
footprint CAP-0402 (0402 (1005M) Capacitor)
pins: 1, 2

## GRM155R61C105MA12D
designator C?  Capacitance: 1uF  (hidden comment: *)
Capacitor, Ceramic (MLCC), 1uF, ±20%, 16V, X5R, ±20%, SMD 0402; Manufacturer: Murata Electronics; Manufacturer Part Number: GRM155R61C105MA12D; Package Size: 0402; JLCPCB Basic Part: No; JLCPCB Part Number: C181017; Supplier 1: LCSC; Category: Capacitors - MLCC; Supplier Part Number 1: C181017; Tolerance: ±20%; Voltage Rating: 16V; Temperature Coefficient: X5R; RoHS: Yes; ComponentLink1Description: Datasheet; ComponentLink1URL: https://wmsc.lcsc.com/wmsc/upload/file/pdf/v2/lcsc/2012011837_Murata-Electronics-GRM155R61C105MA12D_C181017.pdf; ComponentLink2Description: JLCPCB Part URL; ComponentLink2URL: https://jlcpcb.com/partdetail/C181017; ComponentLink3Description: LCSC Part URL; ComponentLink3URL: https://lcsc.com/product-detail/Multilayer-Ceramic-Capacitors-MLCC---SMD-SMT_Murata-Electronics-Murata-Electronics-GRM155R61C105MA12D_C181017.html
footprint CAP-0402 (0402 (1005M) Capacitor)
pins: 1, 2

## GRM155R61C224MA12D
designator C?  Capacitance: 220nF  (hidden comment: *)
Capacitor, Ceramic (MLCC), 220nF, ±20%, 16V, X5R, ±20%, SMD 0402; Manufacturer: Murata Electronics; Manufacturer Part Number: GRM155R61C224MA12D; Package Size: 0402; JLCPCB Basic Part: No; JLCPCB Part Number: C180445; Supplier 1: LCSC; Category: Capacitors - MLCC; Supplier Part Number 1: C180445; Tolerance: ±20%; Voltage Rating: 16V; Temperature Coefficient: X5R; RoHS: Yes; ComponentLink1Description: Datasheet; ComponentLink1URL: https://wmsc.lcsc.com/wmsc/upload/file/pdf/v2/lcsc/1811081530_Murata-Electronics-GRM155R61C224MA12D_C180445.pdf; ComponentLink2Description: JLCPCB Part URL; ComponentLink2URL: https://jlcpcb.com/partdetail/C180445; ComponentLink3Description: LCSC Part URL; ComponentLink3URL: https://lcsc.com/product-detail/Multilayer-Ceramic-Capacitors-MLCC---SMD-SMT_Murata-Electronics-Murata-Electronics-GRM155R61C224MA12D_C180445.html
footprint CAP-0402 (0402 (1005M) Capacitor)
pins: 1, 2

## GRM155R61C225KE11D
designator C?  Capacitance: 2.2uF  (hidden comment: *)
Capacitor, Ceramic (MLCC), 2.2uF, ±10%, 16V, X5R, ±10%, SMD 0402; Manufacturer: Murata Electronics; Manufacturer Part Number: GRM155R61C225KE11D; Package Size: 0402; JLCPCB Basic Part: No; JLCPCB Part Number: C88944; Supplier 1: LCSC; Category: Capacitors - MLCC; Supplier Part Number 1: C88944; Tolerance: ±10%; Voltage Rating: 16V; Temperature Coefficient: X5R; RoHS: Yes; ComponentLink1Description: Datasheet; ComponentLink1URL: https://wmsc.lcsc.com/wmsc/upload/file/pdf/v2/lcsc/2304140030_Murata-Electronics-GRM155R61C225KE11D_C88944.pdf; ComponentLink2Description: JLCPCB Part URL; ComponentLink2URL: https://jlcpcb.com/partdetail/C88944; ComponentLink3Description: LCSC Part URL; ComponentLink3URL: https://lcsc.com/product-detail/Multilayer-Ceramic-Capacitors-MLCC---SMD-SMT_Murata-Electronics-Murata-Electronics-GRM155R61C225KE11D_C88944.html
footprint CAP-0402 (0402 (1005M) Capacitor)
pins: 1, 2

## GRM155R61C225KE44D
designator C?  Capacitance: 2.2uF  (hidden comment: *)
Capacitor, Ceramic (MLCC), 2.2uF, ±10%, 16V, X5R, ±10%, SMD 0402; Manufacturer: Murata Electronics; Manufacturer Part Number: GRM155R61C225KE44D; Package Size: 0402; JLCPCB Basic Part: No; JLCPCB Part Number: C335109; Supplier 1: LCSC; Category: Capacitors - MLCC; Supplier Part Number 1: C335109; Tolerance: ±10%; Voltage Rating: 16V; Temperature Coefficient: X5R; RoHS: Yes; ComponentLink1Description: Datasheet; ComponentLink1URL: https://wmsc.lcsc.com/wmsc/upload/file/pdf/v2/lcsc/1912111437_Murata-Electronics-GRM155R61C225KE44D_C335109.pdf; ComponentLink2Description: JLCPCB Part URL; ComponentLink2URL: https://jlcpcb.com/partdetail/C335109; ComponentLink3Description: LCSC Part URL; ComponentLink3URL: https://lcsc.com/product-detail/Multilayer-Ceramic-Capacitors-MLCC---SMD-SMT_Murata-Electronics-Murata-Electronics-GRM155R61C225KE44D_C335109.html
footprint CAP-0402 (0402 (1005M) Capacitor)
pins: 1, 2

## GRM155R61C225ME11D
designator C?  Capacitance: 2.2uF  (hidden comment: *)
Capacitor, Ceramic (MLCC), 2.2uF, ±20%, 16V, X5R, ±20%, SMD 0402; Manufacturer: Murata Electronics; Manufacturer Part Number: GRM155R61C225ME11D; Package Size: 0402; JLCPCB Basic Part: No; JLCPCB Part Number: C417153; Supplier 1: LCSC; Category: Capacitors - MLCC; Supplier Part Number 1: C417153; Tolerance: ±20%; Voltage Rating: 16V; Temperature Coefficient: X5R; RoHS: Yes; ComponentLink1Description: Datasheet; ComponentLink1URL: https://wmsc.lcsc.com/wmsc/upload/file/pdf/v2/lcsc/2001071132_Murata-Electronics-GRM155R61C225ME11D_C417153.pdf; ComponentLink2Description: JLCPCB Part URL; ComponentLink2URL: https://jlcpcb.com/partdetail/C417153; ComponentLink3Description: LCSC Part URL; ComponentLink3URL: https://lcsc.com/product-detail/Multilayer-Ceramic-Capacitors-MLCC---SMD-SMT_Murata-Electronics-Murata-Electronics-GRM155R61C225ME11D_C417153.html
footprint CAP-0402 (0402 (1005M) Capacitor)
pins: 1, 2

## GRM155R61C225ME15D
designator C?  Capacitance: 2.2uF  (hidden comment: *)
Capacitor, Ceramic (MLCC), 2.2uF, ±20%, ±20%, SMD 0402; Manufacturer: Murata Electronics; Manufacturer Part Number: GRM155R61C225ME15D; Package Size: 0402; JLCPCB Basic Part: No; JLCPCB Part Number: C710876; Supplier 1: LCSC; Category: Capacitors - MLCC; Supplier Part Number 1: C710876; Tolerance: ±20%; RoHS: Yes; ComponentLink1Description: Datasheet; ComponentLink1URL: https://wmsc.lcsc.com/wmsc/upload/file/pdf/v2/lcsc/2104201134_Murata-Electronics-GRM155R61C225ME15D_C710876.pdf; ComponentLink2Description: JLCPCB Part URL; ComponentLink2URL: https://jlcpcb.com/partdetail/C710876; ComponentLink3Description: LCSC Part URL; ComponentLink3URL: https://lcsc.com/product-detail/Multilayer-Ceramic-Capacitors-MLCC---SMD-SMT_Murata-Electronics-Murata-Electronics-GRM155R61C225ME15D_C710876.html
footprint CAP-0402 (0402 (1005M) Capacitor)
pins: 1, 2

## GRM155R61C225ME44D
designator C?  Capacitance: 2.2uF  (hidden comment: *)
Capacitor, Ceramic (MLCC), 2.2uF, ±20%, 16V, X5R, ±20%, SMD 0402; Manufacturer: Murata Electronics; Manufacturer Part Number: GRM155R61C225ME44D; Package Size: 0402; JLCPCB Basic Part: No; JLCPCB Part Number: C710877; Supplier 1: LCSC; Category: Capacitors - MLCC; Supplier Part Number 1: C710877; Tolerance: ±20%; Voltage Rating: 16V; Temperature Coefficient: X5R; RoHS: Yes; ComponentLink1Description: Datasheet; ComponentLink1URL: https://wmsc.lcsc.com/wmsc/upload/file/pdf/v2/lcsc/2308111636_Murata-Electronics-GRM155R61C225ME44D_C710877.pdf; ComponentLink2Description: JLCPCB Part URL; ComponentLink2URL: https://jlcpcb.com/partdetail/C710877; ComponentLink3Description: LCSC Part URL; ComponentLink3URL: https://lcsc.com/product-detail/Multilayer-Ceramic-Capacitors-MLCC---SMD-SMT_Murata-Electronics-Murata-Electronics-GRM155R61C225ME44D_C710877.html
footprint CAP-0402 (0402 (1005M) Capacitor)
pins: 1, 2
